# Altium footprint library MOD_RASPBERRYPI_3B.PcbLib: 1 footprints
Each footprint in its own frame and in the unit in brackets; x right, y up, seen from the top. Pads: shape width x height; smd on the part's side, far side on the other; paste and mask are expansions set on the pad; w line width, h text height; cw(c..) or ccw(c..) is an arc to the next point about the centre after c.
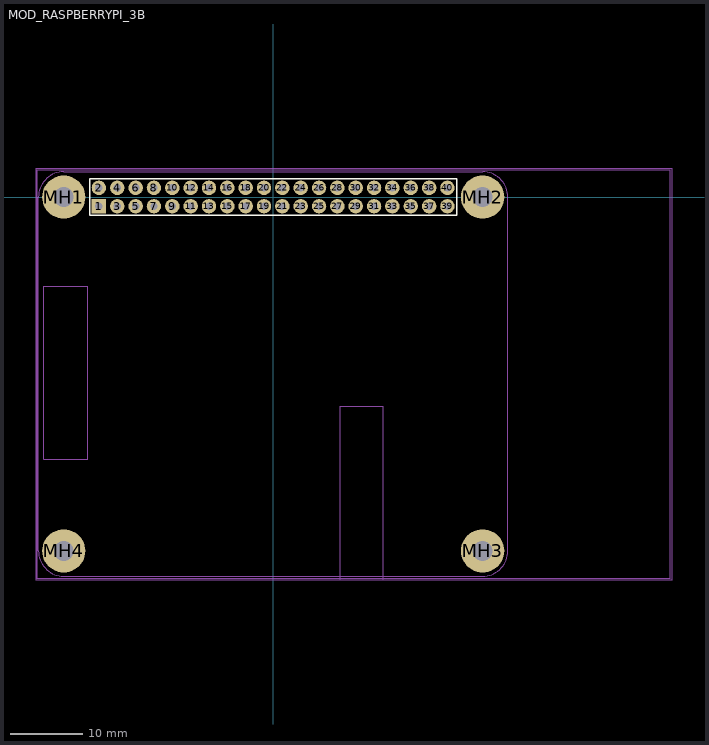
[diagram p0: the footprint, top view; thin cyan lines are the x and y axes]

## MOD_RASPBERRYPI_3B [mm]
pads (44):
  rect 2x2 hole 1.02: 1(-24.13,-1.27)
  round 2 hole 1.02: 2(-24.13,1.27) 3(-21.59,-1.27) 4(-21.59,1.27) 5(-19.05,-1.27) 6(-19.05,1.27) 7(-16.51,-1.27) 8(-16.51,1.27) 9(-13.97,-1.27) 10(-13.97,1.27) 11(-11.43,-1.27) 12(-11.43,1.27) 13(-8.89,-1.27) 14(-8.89,1.27) 15(-6.35,-1.27) 16(-6.35,1.27) 17(-3.81,-1.27) 18(-3.81,1.27) 19(-1.27,-1.27) 20(-1.27,1.27) 21(1.27,-1.27) 22(1.27,1.27) 23(3.81,-1.27) 24(3.81,1.27) 25(6.35,-1.27) 26(6.35,1.27) 27(8.89,-1.27) 28(8.89,1.27) 29(11.43,-1.27) 30(11.43,1.27) 31(13.97,-1.27) 32(13.97,1.27) 33(16.51,-1.27) 34(16.51,1.27) 35(19.05,-1.27) 36(19.05,1.27) 37(21.59,-1.27) 38(21.59,1.27) 39(24.13,-1.27) 40(24.13,1.27)
  round 6 hole 2.75: MH1(-29,0) MH2(29,0) MH3(29,-49) MH4(-29,-49)
Top Overlay:
  lines w0.2: -25.4,-2.54 -25.4,2.54 -20.955,2.54 25.4,2.54 25.4,-2.54 -25.4,-2.54
Mechanical 13:
  lines w0.127: -32.715,-52.75 -32.715,3.75 55,3.75 55,-52.75 -32.715,-52.75
  lines w0.15: -32.5,-49 ccw(c-29,-49) -29,-52.5 29,-52.5 ccw(c29,-49) 32.5,-49 32.5,0 ccw(c29,0) 29,3.5 -29,3.5 ccw(c-29,0) -32.5,0 -32.5,-49 ; -31.8,-36.322 -31.8,-12.319 -25.654,-12.319 -25.654,-36.322 -31.8,-36.322 ; 9.271,-52.959 9.271,-28.956 15.24,-28.956 15.24,-52.959 9.271,-52.959
  text "CAMERA" at 13.081,-45.593 h1.52
  text "DISPLAY" at -28.067,-30.099 h1.52
Mechanical 15:
  lines w0.127: -32.868,-53 55.25,-53 55.25,4 -32.868,4 -32.868,-53
Mechanical 17:
  text "'.Designator'" at -25.25,-53.25 h1
Mechanical 19:
  text "'.Comment'" at -13.5,-53.25 h1
3D body "Raspberry Pi 3.STEP": height 8.49, standoff -10.1, extent -34.773,-53.831 54.864,3.48